# Altium footprint library Chickenfood.PcbLib: 40 footprints (part 3 of 3)
Each footprint in its own frame and in the unit in brackets; x right, y up, seen from the top. Pads: shape width x height; smd on the part's side, far side on the other; paste and mask are expansions set on the pad; w line width, h text height; cw(c..) or ccw(c..) is an arc to the next point about the centre after c.
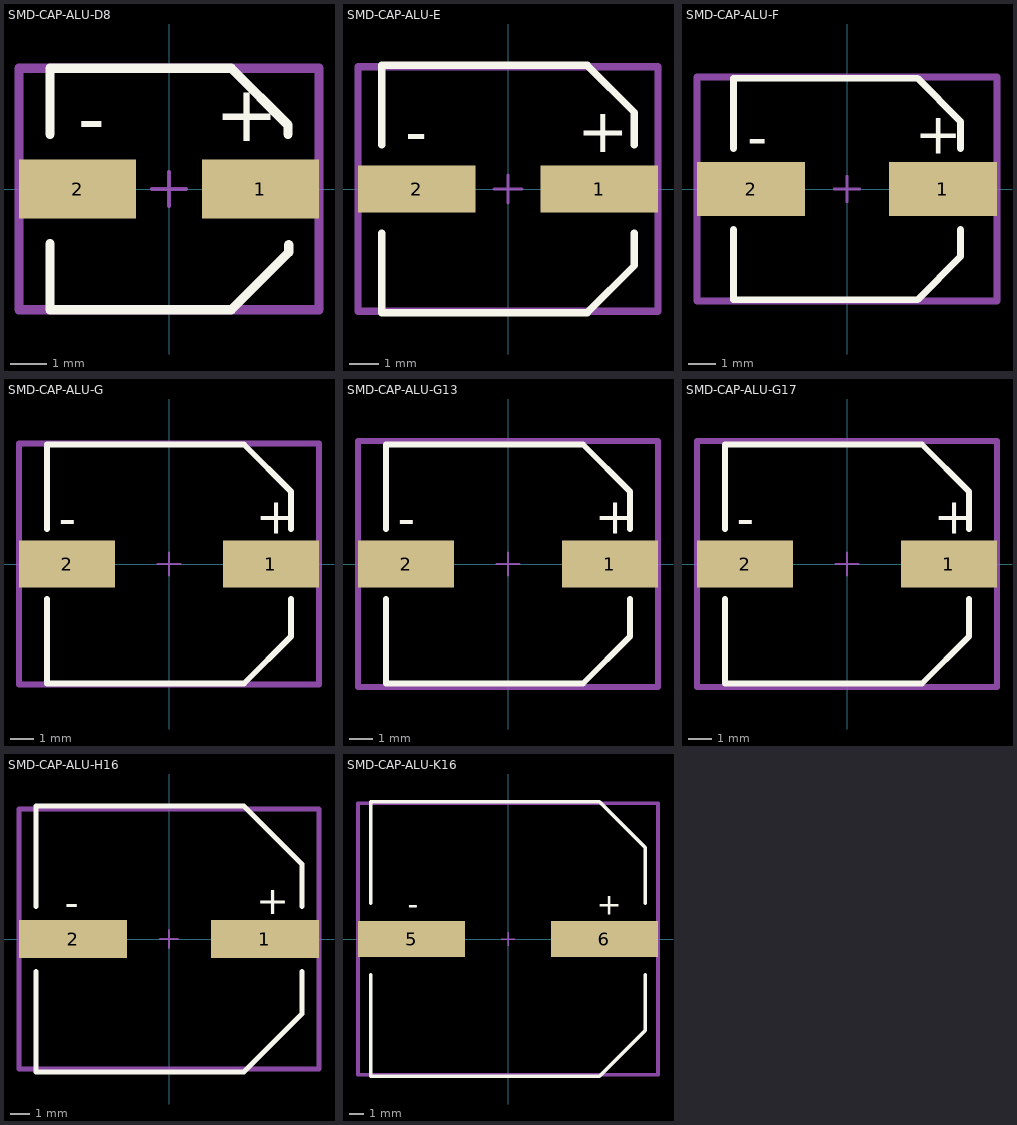
[diagram p2: the footprints below, top view; thin cyan lines are the x and y axes]

## SMD-CAP-ALU-D8 [mm] "Ø6.3mm x 7.7mm"
pads (2):
  rect 3.2x1.6 smd: 1(2.5,0) 2(-2.5,0)
Top Overlay:
  lines w0.254: -3.25,-1.5 -3.25,-3.3 1.7,-3.3 3.275,-1.725 3.275,-1.525 ; -3.25,1.5 -3.25,3.3 1.7,3.3 3.25,1.75 3.25,1.5
  text "+" at 1.25,1.3 h1.52
  text "-" at -2.5,1.2 h1.52
Top Courtyard:
  lines w0.254: -4.1,-3.3 4.1,-3.3 4.1,3.3 -1.6,3.3 -4.1,3.3 -4.1,-3.3
Top Designator:
  text ".Designator" at -3.599,-0.362 h1.6
Top Component Center (Mech17):
  lines w0.1: -0.475,0 0.475,0 ; 0,-0.475 0,0.475
3D body "SMD-CAP-ALU-D8.STEP": height 7.7, standoff 0, extent -3.5,-3.3 3.5,3.3

## SMD-CAP-ALU-E [mm] "Ø8.0mm x 6.2mm"
pads (2):
  rect 4x1.6 smd: 1(3.1,0) 2(-3.1,0)
Top Overlay:
  lines w0.254: -4.3,-1.5 -4.3,-4.2 2.7,-4.2 4.3,-2.6 4.3,-1.5 ; -4.3,1.5 -4.3,4.2 2.7,4.2 4.3,2.6 4.3,1.5
  text "+" at 2.35,1.25 h1.52
  text "-" at -3.5,1.2 h1.52
Top Courtyard:
  lines w0.254: -5.1,-4.15 5.1,-4.15 5.1,4.15 -1.8,4.15 -5.1,4.15 -5.1,-4.15
Top Designator:
  text ".Designator" at -4.506,-0.453 h2
Top Component Center (Mech17):
  lines w0.1: -0.475,0 0.475,0 ; 0,-0.475 0,0.475
3D body "SMD-CAP-ALU-E.STEP": height 6.2, standoff 0, extent -4.5,-4.15 4.5,4.15

## SMD-CAP-ALU-F [mm] "Ø8.0mm x 10.2mm"
pads (2):
  rect 4x2 smd: 1(3.55,0) 2(-3.55,0)
Top Overlay:
  lines w0.254: -4.2,-1.5 -4.2,-4.1 2.6,-4.1 4.2,-2.5 4.2,-1.5 ; -4.2,1.5 -4.2,4.1 2.6,4.1 4.2,2.5 4.2,1.5
  text "-" at -3.7,1.2 h1.52
  text "+" at 2.5,1.3 h1.52
Top Courtyard:
  lines w0.254: -5.55,-4.15 -5.55,4.15 -1.2,4.15 5.55,4.15 5.55,-4.15 -5.55,-4.15
Top Designator:
  text ".Designator" at -4.952,-0.498 h2.2
Top Component Center (Mech17):
  lines w0.1: -0.475,0 0.475,0 ; 0,-0.475 0,0.475
3D body "SMD-CAP-ALU-F.STEP": height 10.2, standoff 0, extent -4.95,-4.15 4.95,4.15

## SMD-CAP-ALU-G [mm] "Ø10.0mm x 10.2mm"
pads (2):
  rect 4.1x2 smd: 1(4.35,0) 2(-4.35,0)
Top Overlay:
  lines w0.254: -5.2,-1.5 -5.2,-5.1 3.2,-5.1 5.2,-3.1 5.2,-1.5 ; -5.2,1.5 -5.2,5.1 3.2,5.1 5.2,3.1 5.2,1.5
  text "-" at -4.7,1.2 h1.52
  text "+" at 3.7,1.3 h1.52
Top Courtyard:
  lines w0.254: -6.4,-5.15 -6.4,5.15 -1.4,5.15 6.4,5.15 6.4,-5.15 -6.4,-5.15
Top Designator:
  text ".Designator" at -5.632,-0.567 h2.5
Top Component Center (Mech17):
  lines w0.1: -0.475,0 0.475,0 ; 0,-0.475 0,0.475
3D body "SMD-CAP-ALU-G.STEP": height 10.2, standoff 0, extent -5.8,-5.15 5.8,5.15

## SMD-CAP-ALU-G13 [mm] "Ø10.0mm x 13.5mm"
pads (2):
  rect 4.1x2 smd: 1(4.35,0) 2(-4.35,0)
Top Overlay:
  lines w0.254: -5.2,-1.5 -5.2,-5.1 3.2,-5.1 5.2,-3.1 5.2,-1.5 ; -5.2,1.5 -5.2,5.1 3.2,5.1 5.2,3.1 5.2,1.5
  text "-" at -4.7,1.2 h1.52
  text "+" at 3.7,1.3 h1.52
Top Courtyard:
  lines w0.254: -6.4,-5.25 6.4,-5.25 6.4,5.25 -0.2,5.25 -6.4,5.25 -6.4,-5.25
Top Designator:
  text ".Designator" at -5.859,-0.589 h2.6
Top Component Center (Mech17):
  lines w0.1: -0.475,0 0.475,0 ; 0,-0.475 0,0.475
3D body "SMD-CAP-ALU-G13.step": height 14, standoff 0, extent -6.15,-5.25 6.15,5.25

## SMD-CAP-ALU-G17 [mm] "Ø10.0mm x 16.5mm"
pads (2):
  rect 4.1x2 smd: 1(4.35,0) 2(-4.35,0)
Top Overlay:
  lines w0.254: -5.2,-1.5 -5.2,-5.1 3.2,-5.1 5.2,-3.1 5.2,-1.5 ; -5.2,1.5 -5.2,5.1 3.2,5.1 5.2,3.1 5.2,1.5
  text "-" at -4.7,1.2 h1.52
  text "+" at 3.7,1.3 h1.52
Top Courtyard:
  lines w0.254: -6.4,-5.25 6.4,-5.25 6.4,5.25 -2.8,5.25 -6.4,5.25 -6.4,-5.25
Top Designator:
  text ".Designator" at -5.859,-0.589 h2.6
Top Component Center (Mech17):
  lines w0.1: -0.475,0 0.475,0 ; 0,-0.475 0,0.475
3D body "SMD-CAP-ALU-G17.step": height 17, standoff 0, extent -6.15,-5.25 6.15,5.25

## SMD-CAP-ALU-H16 [mm] "Ø12.5mm x 16.5mm"
pads (2):
  rect 5.7x2 smd: 1(5.05,0) 2(-5.05,0)
Top Overlay:
  lines w0.254: -7,-1.7 -7,-7 3.95,-7 7,-3.95 7,-1.7 ; -7,1.7 -7,7 3.95,7 7,3.95 7,1.7
  text "+" at 4.6,1.3 h1.52
  text "-" at -5.5,1.2 h1.52
Top Courtyard:
  lines w0.254: -7.9,-6.85 -7.9,6.85 0,6.85 7.9,6.85 7.9,-6.85 -7.9,-6.85
Top Designator:
  text ".Designator" at -6.758,-0.68 h3
Top Component Center (Mech17):
  lines w0.1: -0.475,0 0.475,0 ; 0,-0.475 0,0.475
3D body "SMD-CAP-ALU-H16.step": height 17, standoff 0, extent -7.75,-6.85 7.75,6.85

## SMD-CAP-ALU-K16 [mm] "Ø18mm x 16.5mm"
pads (2):
  rect 7.5x2.5 smd: 5(-6.75,0) 6(6.75,0)
Top Overlay:
  lines w0.254: -9.6,-2.5 -9.6,-9.6 6.4,-9.6 9.6,-6.4 9.6,-2.5 ; -9.6,2.5 -9.6,9.6 6.4,9.6 9.6,6.4 9.6,2.5
  text "+" at 6.2,1.7 h1.52
  text "-" at -7,1.7 h1.52
Top Courtyard:
  lines w0.254: -10.5,-9.5 10.5,-9.5 10.5,9.5 -2,9.5 -10.5,9.5 -10.5,-9.5
Top Designator:
  text ".Designator" at -9.011,-0.906 h4
Top Component Center (Mech17):
  lines w0.1: -0.475,0 0.475,0 ; 0,-0.475 0,0.475
3D body "SMD-CAP-ALU-K16.step": height 16.5, standoff 0, extent -10.2,-9.5 10.2,9.5